# Altium footprint library Lib_altium.PcbLib: 4 footprints
Each footprint in its own frame and in the unit in brackets; x right, y up, seen from the top. Pads: shape width x height; smd on the part's side, far side on the other; paste and mask are expansions set on the pad; w line width, h text height; cw(c..) or ccw(c..) is an arc to the next point about the centre after c.
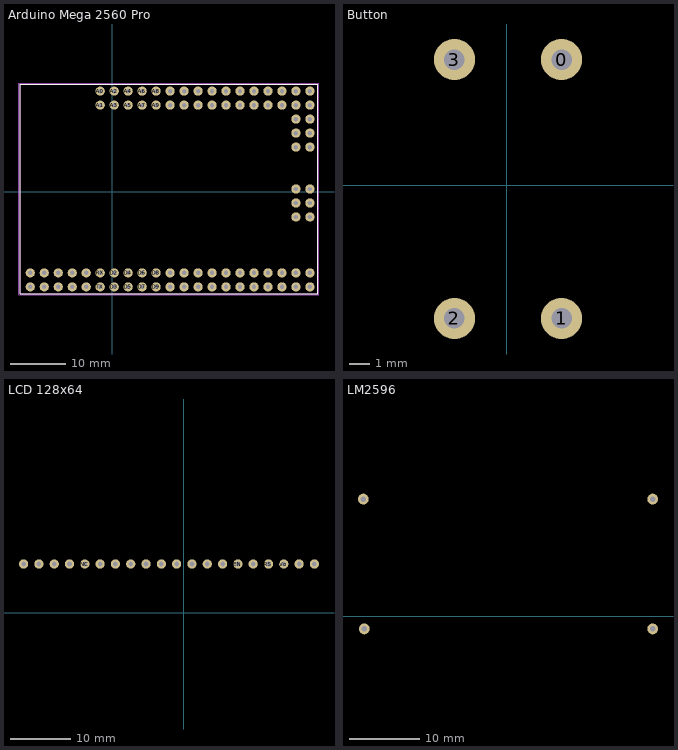
[diagram p0: the footprints below, top view; thin cyan lines are the x and y axes]

## Arduino Mega 2560 Pro [mil]
pads (86):
  round 66 hole 31.5: 3V3_1(-287.13,-680) 3V3_2(-287.13,-580) 5V_1(-387.13,-680) 5V_2(-387.13,-580) 5V_3(1412.87,20) A0(-87.13,720) A1(-87.13,620) A2(12.87,720) A3(12.87,620) A4(112.87,720) A5(112.87,620) A6(212.87,720) A7(212.87,620) A8(312.87,720) A9(312.87,620) A10(412.87,720) A11(412.87,620) A12(512.87,720) A13(512.87,620) A14(612.87,720) A15(612.87,620) AREF(-187.13,-580) D2(12.87,-580) D3(12.87,-680) D4(112.87,-580) D5(112.87,-680) D6(212.87,-580) D7(212.87,-680) D8(312.87,-580) D9(312.87,-680) D10(412.87,-580) D11(412.87,-680) D12(512.87,-580) D13(512.87,-680) D14(612.87,-580) D15(612.87,-680) D16(712.87,-580) D17(712.87,-680) D18(812.87,-580) D19(812.87,-680) D20(912.87,-580) D21(912.87,-680) D22(1012.87,-580) D23(1012.87,-680) D24(1112.87,-580) D25(1112.87,-680) D26(1212.87,-580) D27(1212.87,-680) D28(1312.87,-580) D29(1312.87,-680) D30(1412.87,-580) D31(1412.87,-680) D32(712.87,720) D33(712.87,620) D34(812.87,720) D35(812.87,620) D36(912.87,720) D37(912.87,620) D38(1012.87,720) D39(1012.87,620) D40(1112.87,720) D41(1112.87,620) D42(1212.87,720) D43(1212.87,620) D44(1312.87,720) D45(1312.87,620) D46(1412.87,720) D47(1412.87,620) D48(1412.87,520) D49(1312.87,520) D50(1412.87,420) D51(1312.87,420) D52(1412.87,320) D53(1312.87,320) GND_1(-487.13,-680) GND_2(-487.13,-580) GND_3(1412.87,-180) MISO(1312.87,20) MOSI(1412.87,-80) RESET(1312.87,-180) RST(-187.13,-680) RX(-87.13,-580) SCK(1312.87,-80) TX(-87.13,-680) VIN_1(-587.13,-680) VIN_2(-587.13,-580)
Top Overlay:
  lines w5: -657.99,-728.03 -657.99,768.03 1467.99,768.03 1467.99,-728.03 -657.99,-728.03
Mechanical 13:
  lines w5: -657.99,-728.03 -657.99,768.03 1467.99,768.03 1467.99,-728.03 -657.99,-728.03
Mechanical 15:
  lines w1.97: -667.83,-737.87 1477.83,-737.87 1477.83,777.87 -667.83,777.87 -667.83,-737.87
3D body "MEGA 2560 PRO (EMBED).stp": height 234, standoff -1, extent -659.65,-730 1469.65,766.06

## Button [mm] "Big But"
pads (4):
  round 2 hole 1: 0(2.667,6.096) 1(2.667,-6.477) 2(-2.54,-6.477) 3(-2.54,6.096)
3D body "User Library-Part1-206.sldprt": height 9.81, standoff -4.14, extent -5.969,-7.02 5.861,6.512

## LCD 128x64 [mil]
pads (20):
  round 60 hole 30: BLA(-945,320) BLK(-1045,320) DB0(255,320) DB1(155,320) DB2(55,320) DB3(-45,320) DB4(-145,320) DB5(-245,320) DB6(-345,320) DB7(-445,320) EN(355,320) GND(855,320) NC(-645,320) PSB(-545,320) R/W(455,320) RS(555,320) RST(-745,320) Vcc(755,320) Vo(655,320) Vout(-845,320)
3D body "User Library-GLCD128x64(KS0108).SLDPRT": height 378.46, standoff -117.61, extent -1595.71,220 2065.71,2975.9

## LM2596 [mil]
pads (4):
  round 60 hole 30: IN+(665,655) IN-(670,-70) OUT+(2280,655) OUT-(2280,-70)
3D body "LM2596.step": height 516.25, standoff 0.11, extent 608.86,-121.77 2341.14,705